# Altium schematic symbol library GyokuRe.SchLib: 1131 symbols (part 5 of 8) (continued)
## LM556
designator U?
Dual Timer; ComponentAvailability: Obsolete; Published: 15-Apr-2002; LatestRevisionDate: 06-Jun-2005; LatestRevisionNote: Stylized 3D Model Added.; DatasheetVersion: Feb-1995; PackageVersion: 2000; PackageReference: J14A; Publisher: Altium Limited; PackageDescription: DIP; 14 Leads; Row Spacing 7.62 mm; Pitch 2.54 mm; ComponentLink1Description: Manufacturer Link; ComponentLink1URL: http://www.national.com/; ComponentLink2Description: Datasheet; ComponentLink2URL: http://www.national.com/ds.cgi/LM/LM556.pdf; ComponentLink3Description: Discontinuation Notice; ComponentLink3URL: http://www.national.com/obs/obsolescence.txt; ComponentLink4Description: URL Link1; ComponentLink4URL: http://www.national.com/pf/LM/LM556.html
footprint DIP-14 (DIP; 14 Leads; Row Spacing 7.62 mm; Pitch 2.54 mm)
pins on every part: 7 GND (power), 14 VCC (power)
part A pins: 1 DISC (oc), 2 THR (in), 3 CVOLT (in), 4 ~{RST} (in), 5 OUT (out), 6 TRIG (in)
part B pins: 8 TRIG (in), 9 OUT (out), 10 ~{RST}, 11 CVOLT (in), 12 THR (in), 13 DISC (oc)

## LM567
designator U?  (value not drawn)
General purpose tone decoders; Manufacturer: National Semiconductor Corporation; Vendor: Digikey; Bandwidth: adjustable from 0 to 14%; Center frequency: Adjustable from 0.01 Hz to 500 kHz; Published: 13-April-2009; Publisher: Hoang Nguyen; ComponentLink1Description: Digikey Part Link; ComponentLink2Description: Open Datasheet; ComponentLink2URL: H:\LIBRARY\LIBRARY.Datasheet\LM567.pdf
footprint IC14N
pins: 1 C1 (power), 2 C2 (in), 3 Input (out), 4 V+ (in), 5 R1 (in), 6 R1-C1 (in), 7 GND (in), 8 Output (power)

## LM741
designator U?
Operational Amplifier, 8-pin MDIP; PartNumber: LM741CN; Manufacturer: National Semiconductor; PackageTopMarking: NSUZXYTTE#*LM*741CN; PowerWise: N; CompType: Amplifiers; Published: 4-Dec-2008; LatestRevisionDate: 13-Jan-2009; LatestRevisionNote: Sim Model Added.; DatasheetVersion: Aug-2000; PackageVersion: revG, May-2006; PackageReference: N08E; Publisher: Altium Limited; PackageDescription: MDIP, .365 x .250 x .130in, 8 Lead, .100in Pitch; Supplier 1: Farnell; Supplier Part Number 1: 1523833; Supplier 2: Farnell; Supplier Part Number 2: 9486780; RoHS: N; PinCount: 8; Code_JEDEC: MS-001-BA; ComponentLink1Description: LM741 Datasheet; ComponentLink1URL: http://www.national.com/ds/LM/LM741.pdf; ComponentLink2Description: LM741 Web Page; ComponentLink2URL: http://www.national.com/pf/LM/LM741.html; ComponentLink3Description: N08E Package Page; ComponentLink3URL: http://www.national.com/packaging/folders/n08e.html
footprint DIP-8 (DIP, 8-Pin, Row Spacing 7.62 mm, Pitch 2.54 mm)
simulation model LM741 (SUBCKT)
pins: 1 OFS NULL, 2 IN- (in), 3 IN+ (in), 4 V- (power), 5 OFS NULL, 6 OUT (out), 7 V+ (power), 8 NC

## LM741_1
designator IC?, comment LM741
Single OA
footprint DIP8/W0.3 (8 PIN, W 300mil, Pin to pin 100mil)
pins: 1 Vos, 2 IN- (in), 3 IN+ (in), 4 -V, 5 Vos, 6 OUT (out), 7 +V

## LM1084IS-ADJ
designator U?
5A Low Dropout Positive Regulators; Vendor: Digikey; Published: 5-Jan-2004; DatasheetDocument: Aug-2002; Publisher: Altium Limited; ComponentLink1Description: Digikey Part Link; ComponentLink2Description: Open Datasheet; ComponentLink2URL: H:\LIBRARY\LIBRARY.Datasheet\
footprint TO-263 (TO-263-AB; 3 Leads (1 Cropped); Body 14.35 (inc. leads) x 10.41 mm (LxW max))
pcadlib TO-263 (TO-263-AB; 3 Leads (1 Cropped); Body 14.35 (inc. leads) x 10.41 mm (LxW max))
pins: 1 "Output", 2 OUT (power) "Output", 3 IN (power) "Input"

## LM1117
designator U?
footprint SOT-223 (SOT-223/SC-73; 4 Leads; Body 6.7 x 7.3 mm, inc. leads (LxW max))
pins: 1 GND, 2 VOUT, 3 VIN

## LM1117_1
designator U?, comment LM1117
footprint SOT-223 (SOT-223/SC-73; 4 Leads; Body 6.7 x 7.3 mm, inc. leads (LxW max))
pins: 1 GND, 2 VOUT, 3 VIN

## LM1117_2
designator IC?, comment LM1117
3v3; Value: LM317
footprint SOT223-4N (SOT223, 4-Leads, Body 6.5x3.5mm, Pitch 2.3mm, Lead Span 7mm, IPC Medium Density)
pins: 1 ADJ/G, 2 OUT, 3 IN, 4 Tab

## LM1117MP-3.3TR
designator U?  (value not drawn)
3.3V 800mA Low-Dropout Linear Regulator; PSpiceTemplate: X^@REFDES %IN %OUT %GND @MODEL; Vendor: Digikey; Volt (Max): 20V; Publisher: Hoang Nguyen; ComponentLink1URL: http://search.digikey.com/scripts/DkSearch/dksus.dll?Detail&name=LM1117MP-3.3TR-ND; ComponentLink1Description: Digikey Part Link; ComponentLink2Description: Open Datasheet; ComponentLink2URL: H:\LIBRARY\LIBRARY.Datasheet\LM1117.pdf; Published: 13-April-2009; V out: 3.3V; Output Current (max): 800mA; Price: 4.000 VND
footprint SOT-223 3-Lead
footprint SOT-223 3N
footprint TO-252
pins: 1 ADJ/GND (power), 2 OUT (out), 3 IN (in)

## LM2574HVN-5.0
designator U?
Simple Switcher 0.5A Step Down Voltage Regulator; Published: 15-Apr-2002; LatestRevisionDate: 06-Jun-2005; LatestRevisionNote: Stylized 3D Model Added.; DatasheetVersion: Jun-1999; PackageVersion: Sep-1997; PackageReference: N08E; Publisher: Altium Limited; PackageDescription: DIP; 8 Leads; Row Spacing 7.62 mm; Pitch 2.54 mm; ComponentLink1Description: Manufacturer Link; ComponentLink1URL: http://www.national.com/; ComponentLink2Description: Datasheet; ComponentLink2URL: http://www.national.com/ds.cgi/LM/LM2574.pdf; ComponentLink3Description: URL Link1; ComponentLink3URL: http://www.national.com/pf/LM/LM2574HV.html
footprint DIP-8 (DIP; 8 Leads; Row Spacing 7.62 mm; Pitch 2.54 mm)
pins: 1 FB (in), 2 SGND (power), 3 ~{ON}/OFF (in), 4 PGND (power), 5 IN (power), 6 NC, 7 OUT (power), 8 NC

## LM2574HVN-ADJ
designator U?
Simple Switcher 0.5A Step Down Voltage Regulator; Published: 15-Apr-2002; LatestRevisionDate: 06-Jun-2005; LatestRevisionNote: Stylized 3D Model Added.; DatasheetVersion: Jun-1999; PackageVersion: Sep-1997; PackageReference: N08E; Publisher: Altium Limited; PackageDescription: DIP; 8 Leads; Row Spacing 7.62 mm; Pitch 2.54 mm; ComponentLink1Description: Manufacturer Link; ComponentLink1URL: http://www.national.com/; ComponentLink2Description: Datasheet; ComponentLink2URL: http://www.national.com/ds.cgi/LM/LM2574.pdf; ComponentLink3Description: URL Link1; ComponentLink3URL: http://www.national.com/pf/LM/LM2574HV.html
footprint DIP-8 (DIP; 8 Leads; Row Spacing 7.62 mm; Pitch 2.54 mm)
pins: 1 FB (in), 2 SGND (power), 3 ~{ON}/OFF (in), 4 PGND (power), 5 IN (power), 6 NC, 7 OUT (power), 8 NC

## LM2575
designator U?, comment LM2575HV?-??
Simple Switcher 1A Step Down Voltage Regulator; Note: Tab is connected to GND; Published: 15-Apr-2002; DatasheetVersion: May-1999; PackageVersion: 2000; PackageReference: T05A; Publisher: Altium Limited; PackageDescription: TO, Thru-Hole, Vertical, Heatsink Mounted; 5 In-Line Leads; Pitch 1.70 mm; Code_JEDEC: TS-001-AA; ComponentLink1Description: Manufacturer Link; ComponentLink1URL: http://www.national.com/; ComponentLink2Description: Datasheet; ComponentLink2URL: http://www.national.com/ds.cgi/LM/LM1575.pdf; ComponentLink3Description: URL Link1; ComponentLink3URL: http://www.national.com/pf/LM/LM2575HV.html
footprint TO220A-5-V (TO, Thru-Hole, Vertical, Heatsink Mounted; 5 In-Line Leads; Pitch 1.70 mm)
footprint TO220B-5-V (TO, Thru-Hole, Vertical, Heatsink Mounted; 5 Bent Staggered Leads; Pitch 1.7 mm)
footprint D2-PACK (D2-PAK; 5 Leads; Body 14.4 (inc. leads) x 10.4 mm (LxW max))
pins: 1 IN (power), 2 OUT (power), 3 GND (power), 4 FB (in), 5 ~{ON}/OFF (in)

## LM2576
designator U?, comment LM2576HV?-??
Simple Switcher 3A Step Down Voltage Regulator; Note: Tab is connected to GND; Published: 15-Apr-2002; DatasheetVersion: May-1999; PackageVersion: 2000; PackageReference: T05A; Publisher: Altium Limited; PackageDescription: TO, Thru-Hole, Vertical, Heatsink Mounted; 5 In-Line Leads; Pitch 1.70 mm; Code_JEDEC: TS-001-AA; ComponentLink1Description: Manufacturer Link; ComponentLink1URL: http://www.national.com/; ComponentLink2Description: Datasheet; ComponentLink2URL: H:\LIBRARY\LIBRARY.Datasheet\LM2576.pdf; ComponentLink3Description: URL Link1; ComponentLink3URL: http://www.national.com/pf/LM/LM2575HV.html; Price: 15000 VND
footprint TO220A-5-V (TO, Thru-Hole, Vertical, Heatsink Mounted; 5 In-Line Leads; Pitch 1.70 mm)
footprint TO220B-5-V (TO, Thru-Hole, Vertical, Heatsink Mounted; 5 Bent Staggered Leads; Pitch 1.7 mm)
footprint D2-PACK5 (D2-PAK; 5 Leads; Body 14.4 (inc. leads) x 10.4 mm (LxW max))
footprint LM2576
pins: 1 IN (power), 2 OUT (power), 3 GND (power), 4 FB (in), 5 ~{ON}/OFF (in)

## LM2588
designator U?
Simple Switcher 5A Flyback Regulator with Shutdown; Note: Tab is connected to GND; Published: 15-Apr-2002; DatasheetVersion: Apr-1998; PackageVersion: 1996; PackageReference: TA07B; Publisher: Altium Limited; PackageDescription: TO, Thru-Hole, Vertical, Heatsink Mounted; 7 Bent Staggered Leads; Pitch 1.27 mm; ComponentLink1Description: Manufacturer Link; ComponentLink1URL: http://www.national.com/; ComponentLink2Description: Datasheet; ComponentLink2URL: http://www.national.com/ds.cgi/LM/LM2588.pdf; ComponentLink3Description: URL Link1; ComponentLink3URL: http://www.national.com/pf/LM/LM2588.html
footprint TO-220-7 (TO-220; 7 Bent Staggered Leads; Solder Pad 35mil)
pins: 1 ~{ON}/OFF, 2 COMPEN, 3 FB (in), 4 GND (power), 5 SW (power), 6 FREQ SYNC (in), 7 IN (power)

## LM2902
designator U?
Low-Power Quad Operational Amplifier; Published: 15-Apr-2002; LatestRevisionDate: 06-Jun-2005; LatestRevisionNote: Stylized 3D Model Added.; DatasheetVersion: May-1999; PackageVersion: 2000; PackageReference: N14A; Publisher: Altium Limited; PackageDescription: DIP; 14 Leads; Row Spacing 7.62 mm; Pitch 2.54 mm; ComponentLink1Description: Manufacturer Link; ComponentLink1URL: http://www.national.com/; ComponentLink2Description: Datasheet; ComponentLink2URL: http://www.national.com/ds.cgi/LM/LM124.pdf; ComponentLink3Description: URL Link1; ComponentLink3URL: http://www.national.com/pf/LM/LM324.html
footprint DIP14 (DIP; 14 Leads; Row Spacing 7.62 mm; Pitch 2.54 mm)
footprint SOIC14 (SOIC, 14-Leads, Body 8.6x3.9mm, Pitch 1.27mm, IPC Medium Density)
pins on every part: 4 V+ (power), 11 GND (power)
part A pins: 1 OUT (out), 2 IN- (in), 3 IN+ (in)
part B pins: 5 IN+ (in), 6 IN- (in), 7 OUT (out)
part C pins: 8 OUT (out), 9 IN- (in), 10 IN+ (in)
part D pins: 12 IN+ (in), 13 IN- (in), 14 OUT (out)

## LM2904
designator U?
Low-Power Dual Operational Amplifier; Published: 15-Apr-2002; LatestRevisionDate: 06-Jun-2005; LatestRevisionNote: Stylized 3D Model Added.; DatasheetVersion: Sep-1999; PackageVersion: Sep-1997; PackageReference: N08E; Publisher: Altium Limited; PackageDescription: DIP; 8 Leads; Row Spacing 7.62 mm; Pitch 2.54 mm; ComponentLink1Description: Manufacturer Link; ComponentLink1URL: http://www.national.com/; ComponentLink2Description: Datasheet; ComponentLink2URL: http://www.national.com/ds.cgi/LM/LM158.pdf; ComponentLink3Description: URL Link1; ComponentLink3URL: http://www.national.com/pf/LM/LM358.html
footprint DIP-8 (DIP; 8 Leads; Row Spacing 7.62 mm; Pitch 2.54 mm)
footprint SOIC8 (SOIC, 8-Leads, Body 4.9x3.9mm, Pitch 1.27mm, IPC Medium Density)
pins on every part: 4 GND (power), 8 V+ (power)
part A pins: 1 OUT (out), 2 IN- (in), 3 IN+ (in)
part B pins: 5 IN+ (in), 6 IN- (in), 7 OUT (out)

## LM3524
designator U?
Regulating Pulse Width Modulator; Published: 15-Apr-2002; LatestRevisionDate: 06-Jun-2005; LatestRevisionNote: Stylized 3D Model Added.; DatasheetVersion: Jun-1999; PackageVersion: 2000; PackageReference: N16E; Publisher: Altium Limited; PackageDescription: DIP; 16 Leads; Row Spacing 7.62 mm; Pitch 2.54 mm; ComponentLink1Description: Manufacturer Link; ComponentLink1URL: http://www.national.com/; ComponentLink2Description: Datasheet; ComponentLink2URL: http://www.national.com/ds.cgi/LM/LM2524D.pdf; ComponentLink3Description: URL Link1; ComponentLink3URL: http://www.national.com/pf/LM/LM3524D.html
footprint DIP16 (DIP; 16 Leads; Row Spacing 7.62 mm; Pitch 2.54 mm)
footprint SOIC16 (SOIC, 16-Leads, Body 10.3x7.5mm, Pitch 1.27mm, IPC Medium Density)
pins: 1 IN- (in), 2 IN+ (in), 3 OSC/SYNC (io), 4 SEN+ (in), 5 SEN- (in), 6 RT, 7 CT, 8 GND (power), 9 CMPEN (out), 10 SD (in), 11 EMIT A, 12 COLL A, 13 COLL B, 14 EMIT B, 15 +VI (power), 16 +5VREF (out)

## LM3914
designator IC?
Value: LM3914
footprint DIP18/W0.3 (18 PIN, W 300mil, Pin to pin 100mil)
pins: 1 ~{Y1}, 2 V-, 3 V+, 4 RL, 5 SIG, 6 RH, 7 OUT, 8 ADJ, 9 MODE, 10 ~{Y10}, 11 ~{Y9}, 12 ~{Y8}, 13 ~{Y7}, 14 ~{Y6}, 15 ~{Y5}, 16 ~{Y4}, 17 ~{Y3}, 18 ~{Y2}

## LM4890
designator U?
Audio power amplifier - 1 W RMS; Value: *; ComponentLink2URL: H:\LIBRARY\LIBRARY.Datasheet\
footprint SOIC8 (SOIC, 8-Leads, Body 4.9x3.9mm, Pitch 1.27mm, IPC Medium Density)
pins: 1 ~{SHDW} (in), 2 BYP (in), 3 IN+ (in), 4 IN- (in), 5 VOL1 (out), 6 VCC (power), 7 GND (power), 8 VOL2 (out)

## LM4990
designator U?
Audio power amplifier - 2 W RMS; Value: *; ComponentLink2URL: H:\LIBRARY\LIBRARY.Datasheet\
footprint SOIC8 (SOIC, 8-Leads, Body 4.9x3.9mm, Pitch 1.27mm, IPC Medium Density)
pins: 1 ~{SHDW} (in), 2 BYP (in), 3 IN+ (in), 4 IN- (in), 5 VOL1 (out), 6 VCC (power), 7 GND (power), 8 VOL2 (out)

## LM6172
designator U?
Dual High-Speed, Low-Power, Low-Distortion, Voltage Feedback Amplifier; Published: 15-Apr-2002; LatestRevisionDate: 06-Jun-2005; LatestRevisionNote: Stylized 3D Model Added.; DatasheetVersion: Sep-1999; PackageVersion: Sep-1997; PackageReference: N08E; Publisher: Altium Limited; PackageDescription: DIP; 8 Leads; Row Spacing 7.62 mm; Pitch 2.54 mm; ComponentLink1Description: Manufacturer Link; ComponentLink1URL: http://www.national.com/; ComponentLink2Description: Datasheet; ComponentLink2URL: http://www.national.com/ds.cgi/LM/LM158.pdf; ComponentLink3Description: URL Link1; ComponentLink3URL: http://www.national.com/pf/LM/LM358.html
footprint DIP-8 (DIP; 8 Leads; Row Spacing 7.62 mm; Pitch 2.54 mm)
footprint SOIC8 (SOIC, 8-Leads, Body 4.9x3.9mm, Pitch 1.27mm, IPC Medium Density)
pins on every part: 4 GND (power), 8 V+ (power)
part A pins: 1 OUT (out), 2 IN- (in), 3 IN+ (in)
part B pins: 5 IN+ (in), 6 IN- (in), 7 OUT (out)

## LMC6482
designator IC?
Dual OA; Value: LMC6482
footprint DIP8/W0.3 (8 PIN, W 300mil, Pin to pin 100mil)
part A pins: 1 OUT (out), 2 IN- (in), 3 IN+ (in), 4 V- (power), 8 V+ (power)
part B pins: 5 IN+ (in), 6 IN- (in), 7 OUT (out)

## LMD18200
designator U?
3A, 55V H-Bridge
footprint TO-220-11 (TO-220; 11 Bent Staggered Leads; Solder Pad 35mil)
pins: 1 BOOTSTRAP 1, 2 OUTPUT 1, 3 DIRECTION, 4 BRAKE, 5 PWM, 6 Vs, 7 GND, 8 CURRENT SENSE, 9 THEMAL, 10 OUTPUT 2, 11 BOOTSTRAP 2

## LMD18201
designator U?
Vendor: Digikey; Published: 13-April-2009; Publisher: Hoang Nguyen; ComponentLink1Description: Digikey Part Link; ComponentLink2Description: Open Datasheet; ComponentLink2URL: H:\LIBRARY\LIBRARY.Datasheet\
pins: 1 bootstrap1, 2 output1 (out), 3 Direction, 4 Brake, 5 PWM, 6 Vss (power), 7 GND (power), 8 Current sense, 9 Thermal Flag, 10 output2 (out), 11 bootstrap2

## Logo
designator *
footprint logo USB
footprint LOGO.Philips
footprint LOGO.SAMSUNG
footprint logo elabvn
footprint SERIAL NUMBER - SMALL
footprint logo S/N top

## LR4102
designator U?
Vendor: Digikey; Published: 13-April-2009; Publisher: Hoang Nguyen; ComponentLink1Description: Digikey Part Link; ComponentLink2Description: Open Datasheet; ComponentLink2URL: H:\LIBRARY\LIBRARY.Datasheet\
pins: 1 D1, 2 H//B, 3 EN, 4 GND (power), 5 INL, 6 VCC (power), 7 NC1 (power), 8 NC2 (power), 9 S1 (power), 10 S2 (power), 11 NC3 (power), 12 IN (power), 13 AGND (power), 14 OSC0 (power), 15 OSC1 (power), 16 XEN (power), 17 TAB (power), 18 DV (power), 19 CLR (power), 20 D8 (power), 21 D4 (power), 22 D2 (power)

## LR 4087B
designator U?
Vendor: Digikey; Published: 13-April-2009; Publisher: Hoang Nguyen; ComponentLink1Description: Digikey Part Link; ComponentLink2Description: Open Datasheet; ComponentLink2URL: H:\LIBRARY\LIBRARY.Datasheet\
pins: 1 VCC (power), 2 XMTR, 3 C1, 4 C2, 5 C3, 6 GND (power), 7 OSC0, 8 OSC1, 9 C4, 10 MUTE, 11 R4, 12 R3, 13 R2, 14 R1, 15 INH, 16 TONE

## LS1240A
designator IC?
Electronic Two-Tone Ringer
footprint DIP8/W0.3 (8 PIN, W 300mil, Pin to pin 100mil)
pins: 1 LINE, 2 GND, 3 SRC, 4 OFC, 5 BUZ, 6 NC, 7 RC, 8 LINE

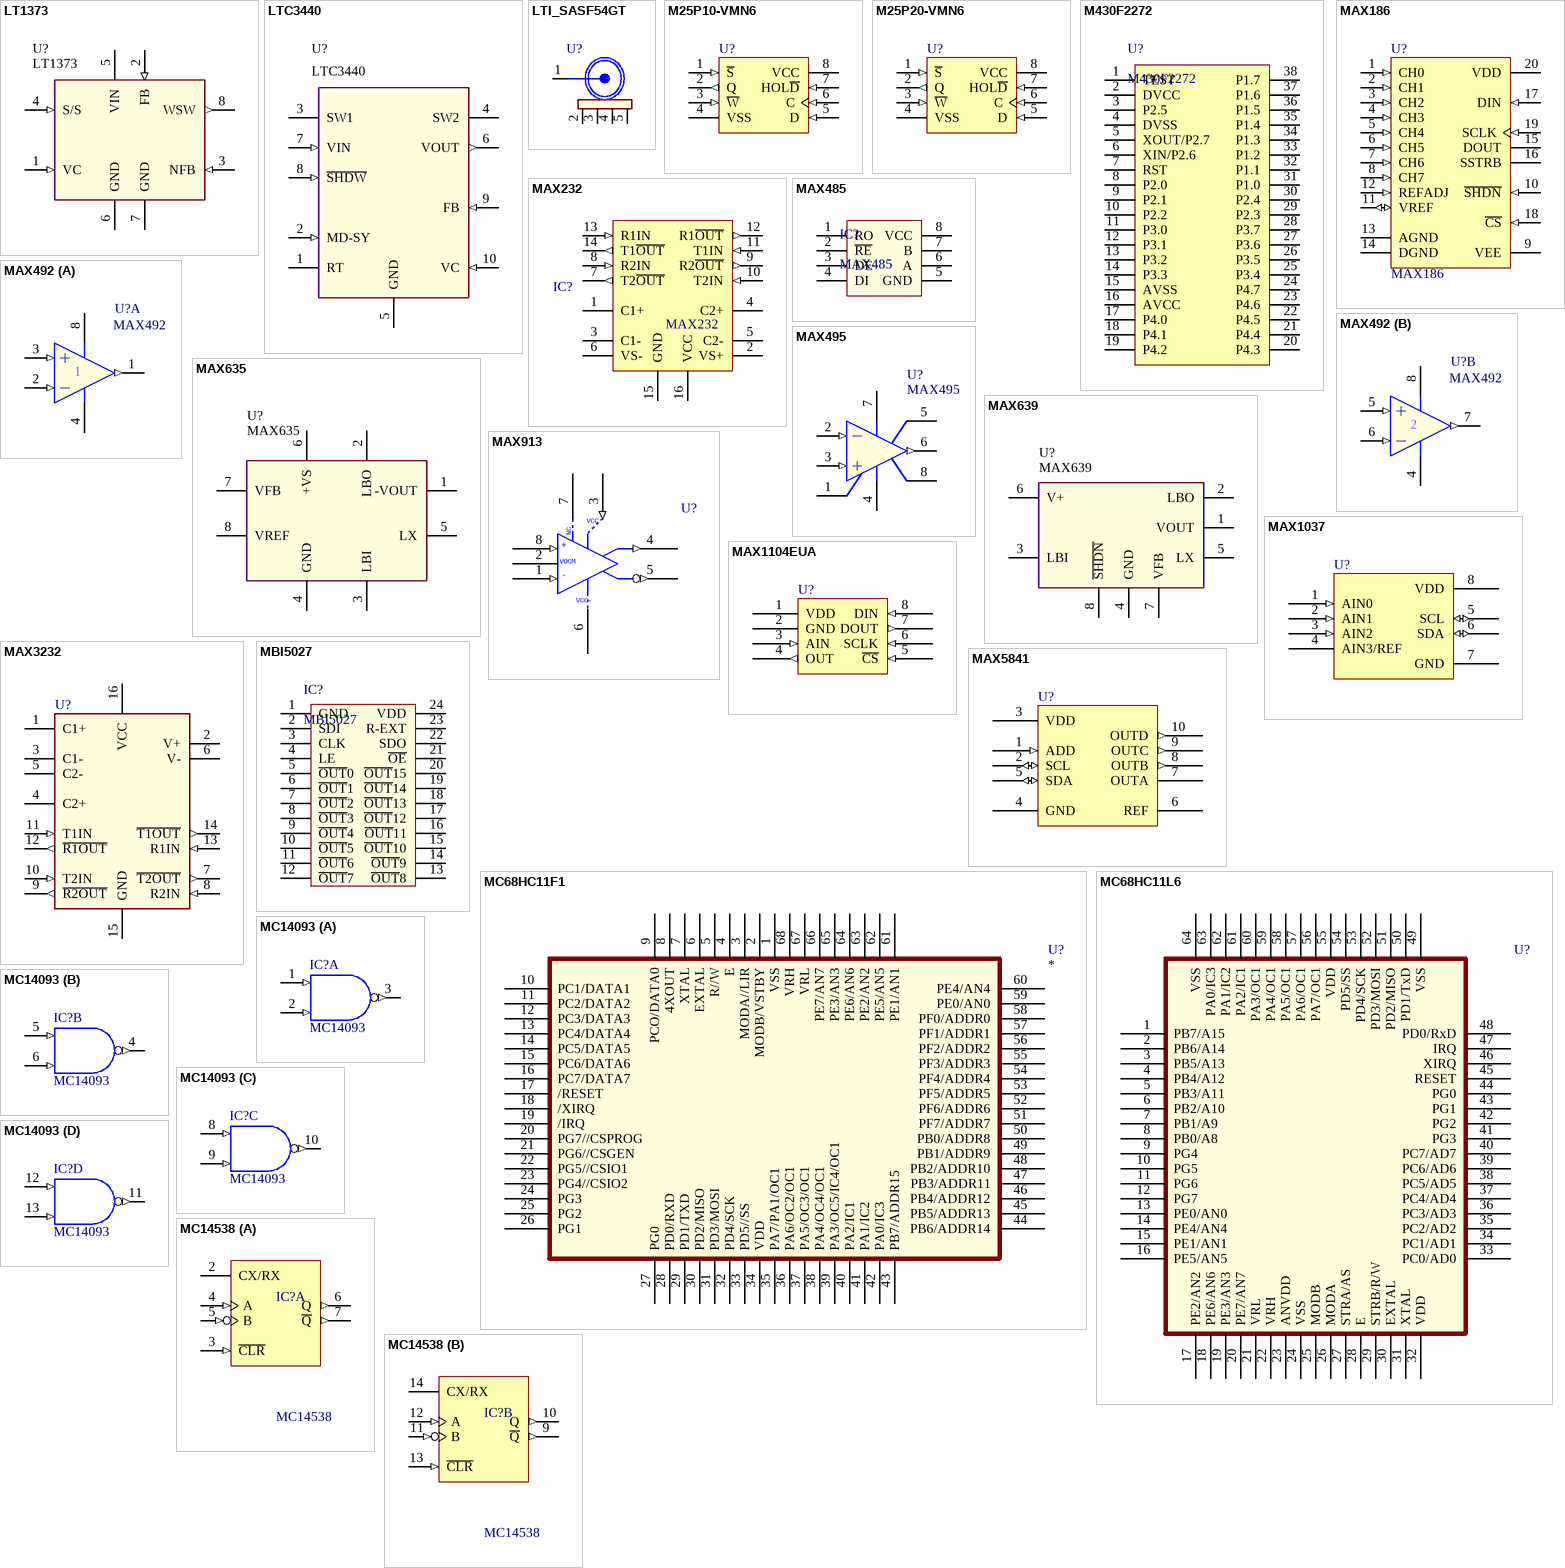
[diagram p29: symbols LT1373 to MC14538]

## LT1373
designator U?
250 KHz Low Supply Current High Efficiency 1.5A Switching Regulator; Value: *; ComponentLink2URL: H:\LIBRARY\LIBRARY.Datasheet\
footprint DIP-8 (DIP; 8 Leads; Row Spacing 7.62 mm; Pitch 2.54 mm)
footprint SOIC8 (SOIC, 8-Leads, Body 4.9x3.9mm, Pitch 1.27mm, IPC Medium Density)
pins: 1 VC (in), 2 FB (in), 3 NFB (in), 4 S/S (in), 5 VIN (power), 6 GND (power), 7 GND (power), 8 WSW (out)

## LTC3440
designator U?
Micropower Synchronous Buck-Boost DC/DC Converter; Value: *; ComponentLink2URL: H:\LIBRARY\LIBRARY.Datasheet\
footprint MSOP-10 (MSOP, Plastic; 10 Leads; Body 3x3 mm; Pitch 0.5 mm)
pins: 1 RT, 2 MD-SY (in), 3 SW1, 4 SW2, 5 GND (power), 6 VOUT (out), 7 VIN (in), 8 ~{SHDW} (in), 9 FB (in), 10 VC (in)

## LTI_SASF54GT
designator U?  (value not drawn)
CONNECTOR, SMA, 3.5MM EDGE LAUNCH JACK, AIR CORE DIELECTRIC; Manufacturer: Lighthorse Technologies Inc; ComponentLink1Description: Digikey Part Link; ComponentLink2Description: Open Datasheet; ComponentLink2URL: H:\LIBRARY\LIBRARY.Datasheet\
footprint SMA_RA
pins: 1, 2 (power), 3 (power), 4 (power), 5 (power)

## M25P10-VMN6
designator U?
8 Mbit, Low Voltage, Serial Flash Memory With 40 MHz SPI Bus Interface; Vendor: Digikey; Published: 5-Jan-2004; DatasheetDocument: Nov-2003; Publisher: Altium Limited; ComponentLink1Description: Digikey Part Link; ComponentLink2Description: Open Datasheet; ComponentLink2URL: H:\LIBRARY\LIBRARY.Datasheet\
footprint SO8_MW/SO8_MN (Small Outline; 8 Leads; Body Width 5.2 mm; Pitch 1.27 mm)
pcadlib SO8_MW/SO8_MN (Small Outline; 8 Leads; Body Width 5.2 mm; Pitch 1.27 mm)
pins: 1 ~{S} (in), 2 Q (out) "Serial Output", 3 ~{W} (in) "Serial Output", 4 VSS (power) "Serial Output", 5 D (in) "Serial Input", 6 C (in) "Serial Input", 7 HOL~{D} (in) "Serial Input", 8 VCC (power) "Serial Input"

## M25P20-VMN6
designator U?
8 Mbit, Low Voltage, Serial Flash Memory With 40 MHz SPI Bus Interface; Vendor: Digikey; Published: 5-Jan-2004; DatasheetDocument: Nov-2003; Publisher: Altium Limited; ComponentLink1Description: Digikey Part Link; ComponentLink2Description: Open Datasheet; ComponentLink2URL: H:\LIBRARY\LIBRARY.Datasheet\
footprint SO8_MW/SO8_MN (Small Outline; 8 Leads; Body Width 5.2 mm; Pitch 1.27 mm)
pcadlib SO8_MW/SO8_MN (Small Outline; 8 Leads; Body Width 5.2 mm; Pitch 1.27 mm)
pins: 1 ~{S} (in), 2 Q (out) "Serial Output", 3 ~{W} (in) "Serial Output", 4 VSS (power) "Serial Output", 5 D (in) "Serial Input", 6 C (in) "Serial Input", 7 HOL~{D} (in) "Serial Input", 8 VCC (power) "Serial Input"

## M430F2272
designator U?
footprint DB038 (SSOP, Plastic; 38 Leads; Body Width 5.3 mm; Pitch 0.65 mm)
pins: 1 TEST, 2 DVCC, 3 P2.5, 4 DVSS, 5 XOUT/P2.7, 6 XIN/P2.6, 7 RST, 8 P2.0, 9 P2.1, 10 P2.2, 11 P3.0, 12 P3.1, 13 P3.2, 14 P3.3, 15 AVSS, 16 AVCC, 17 P4.0, 18 P4.1, 19 P4.2, 20 P4.3, 21 P4.4, 22 P4.5, 23 P4.6, 24 P4.7, 25 P3.4, 26 P3.5, 27 P3.6, 28 P3.7, 29 P2.3, 30 P2.4, 31 P1.0, 32 P1.1, 33 P1.2, 34 P1.3, 35 P1.4, 36 P1.5, 37 P1.6, 38 P1.7

## MAX186
designator U?
Low-Power, 8-Channel Serial 12-Bit ADCs; Published: 16-Jan-2001; LatestRevisionDate: 06-Jun-2005; LatestRevisionNote: Stylized 3D Model Added.; DatasheetVersion: Aug-1996; PackageVersion: 1997; PackageReference: SSOP20; Publisher: Altium Limited; PackageDescription: SSOP; 20 Leads; Body Width 5.3 mm; Pitch 0.65 mm; ComponentLink1Description: Manufacturer Link; ComponentLink1URL: http://www.maxim-ic.com/; ComponentLink2Description: Datasheet; ComponentLink2URL: http://pdfserv.maxim-ic.com/en/ds/MAX186-MAX188.pdf
footprint DIP20 (DIP; 20 Leads; Row Spacing 7.62 mm; Pitch 2.54 mm)
footprint SOIC20-W (SOIC, 20-Leads, Body 12.8x7.5mm, Pitch 1.27mm, IPC Medium Density)
pins: 1 CH0 (in), 2 CH1 (in), 3 CH2 (in), 4 CH3 (in), 5 CH4 (in), 6 CH5 (in), 7 CH6 (in), 8 CH7 (in), 9 VEE (power), 10 ~{SHDN} (in), 11 VREF (io), 12 REFADJ (in), 13 AGND (power), 14 DGND (power), 15 DOUT (hiz), 16 SSTRB (hiz), 17 DIN (in), 18 ~{CS} (in), 19 SCLK (in), 20 VDD (power)

## MAX232
designator IC?
Dual EIA-232 Driver/Receiver; Value: MAX232
footprint DIP16/W0.3 (16 PIN, W 300mil, Pin to pin 100mil)
footprint SO-G16 (Small Outline; 16 Leads; Body Width 3.9 mm; Pitch 1.27 mm)
pins: 1 C1+, 2 VS+ (power), 3 C1-, 4 C2+, 5 C2-, 6 VS- (power), 7 T2~{OUT} (out), 8 R2IN (in), 9 R2~{OUT} (out), 10 T2IN (in), 11 T1IN (in), 12 R1~{OUT} (out), 13 R1IN (in), 14 T1~{OUT} (out), 15 GND (power), 16 VCC (power)

## MAX485
designator IC?
RS232 - RS485 (Same sn75176)
footprint DIP8/W0.3 (8 PIN, W 300mil, Pin to pin 100mil)
footprint SO-8 (8-Pin Small Outline Integrated Circuit 1.27 mm Pitch, IPC Medium Density)
pins: 1 RO "Receiver Output", 2 ~{RE} "Receiver Enable Output", 3 DE "Driver Enable Output", 4 DI "Driver Input", 5 GND, 6 A "RI & NoneDO", 7 B "NoneDI", 8 VCC

## MAX492
designator U?
Dual Voltage-Feedback Operational Amplifier; Published: 23-Sep-2002; LatestRevisionDate: 06-Jun-2005; LatestRevisionNote: Stylized 3D Model Added.; DatasheetVersion: Rev 2; 9/96; PackageVersion: RevB, 21-0043; PackageReference: PA8; Publisher: Altium Limited; PackageDescription: DIP; 8 Leads; Row Spacing 7.62 mm; Pitch 2.54 mm; Code_JEDEC: MS-001-AB; ComponentLink1Description: Manufacturer Link; ComponentLink1URL: http://www.maxim-ic.com/; ComponentLink2Description: Datasheet; ComponentLink2URL: http://pdfserv.maxim-ic.com/en/ds/MAX492-MAX495.pdf
footprint DIP-8 (DIP; 8 Leads; Row Spacing 7.62 mm; Pitch 2.54 mm)
footprint SOIC8 (SOIC, 8-Leads, Body 4.9x3.9mm, Pitch 1.27mm, IPC Medium Density)
pins on every part: 4 VEE (power), 8 VCC (power)
part A pins: 1 OUT (out), 2 IN- (in), 3 IN+ (in)
part B pins: 5 IN+ (in), 6 IN- (in), 7 OUT (out)

## MAX495
designator U?
Single Voltage-Feedback Operational Amplifier; Published: 23-Sep-2002; LatestRevisionDate: 06-Jun-2005; LatestRevisionNote: Stylized 3D Model Added.; DatasheetVersion: Rev 2; 9/96; PackageVersion: RevB, 21-0043; PackageReference: PA8; Publisher: Altium Limited; PackageDescription: DIP; 8 Leads; Row Spacing 7.62 mm; Pitch 2.54 mm; Code_JEDEC: MS-001-AB; ComponentLink1Description: Manufacturer Link; ComponentLink1URL: http://www.maxim-ic.com/; ComponentLink2Description: Datasheet; ComponentLink2URL: http://pdfserv.maxim-ic.com/en/ds/MAX492-MAX495.pdf
footprint DIP-8 (DIP; 8 Leads; Row Spacing 7.62 mm; Pitch 2.54 mm)
footprint SOIC8 (SOIC, 8-Leads, Body 4.9x3.9mm, Pitch 1.27mm, IPC Medium Density)
pins: 1 NULL, 2 IN- (in), 3 IN+ (in), 4 VEE (power), 5 NULL, 6 OUT (out), 7 VCC (power), 8 NC

## MAX635
designator U?
Charge pump voltage inverter; Value: *; ComponentLink2URL: H:\LIBRARY\LIBRARY.Datasheet\
footprint DIP-8 (DIP; 8 Leads; Row Spacing 7.62 mm; Pitch 2.54 mm)
pins: 1 -VOUT, 2 LBO, 3 LBI, 4 GND, 5 LX, 6 +VS, 7 VFB, 8 VREF

## MAX639
designator U?
Low Power Step down switch egulator; Value: *; ComponentLink2URL: H:\LIBRARY\LIBRARY.Datasheet\
footprint DIP-8 (DIP; 8 Leads; Row Spacing 7.62 mm; Pitch 2.54 mm)
pins: 1 VOUT, 2 LBO, 3 LBI, 4 GND, 5 LX, 6 V+, 7 VFB, 8 ~{SHDN}

## MAX913
designator U?  (value not drawn)
Single/Dual, Ultra-Fast, Low-Power, Precision TTL Comparators; Manufacturer: Maxim; Volt: 5V; ComponentLink1Description: Digikey Part Link; ComponentLink2Description: Open Datasheet; ComponentLink2URL: H:\LIBRARY\LIBRARY.Datasheet\
pins: 1 V_IN- (in), 2 VOCM (power), 3 VCC (in), 4 VOUT+ (out), 5 ~{VOUT}- (out), 6 GND (power), 7 NC, 8 V_IN+ (in)
text: +; -; VCC-
